# Altium integrated library CoLib.IntLib: 649 symbols (part 4 of 5)
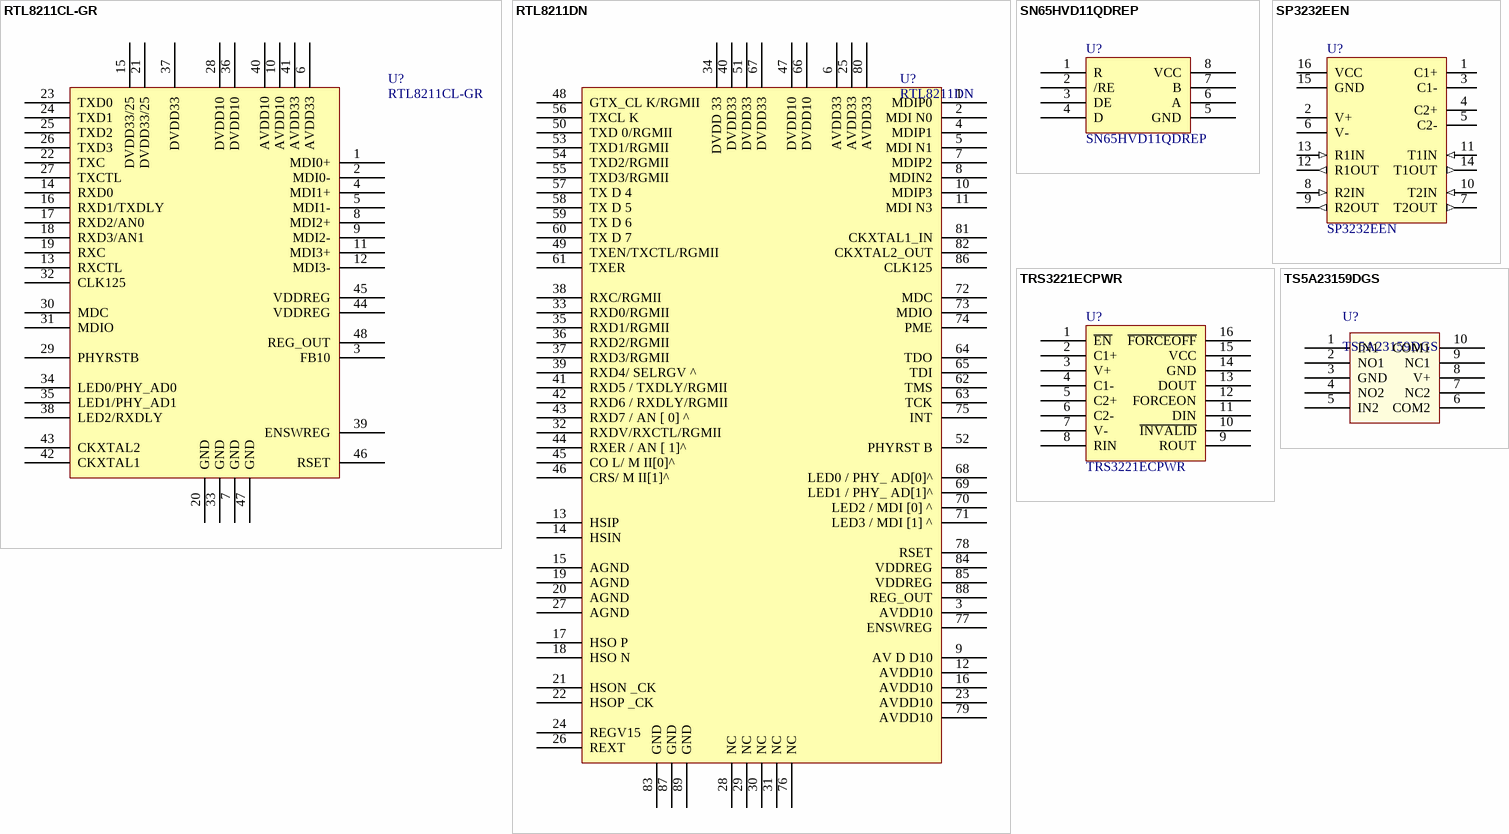
[diagram p42: symbols RTL8211CL-GR to TS5A23159DGS]

## RTL8211DN
designator U?
光口+电口PHY; Manufacturer: RealTek; Name: 网口; Price: 15; Price_Date: 2011-07; Ordering NO.: RTL8211DN
footprint QFN-88 (0.4mm间距)
pins: 1 MDIP0, 2 MDI N0, 3 AVDD10, 4 MDIP1, 5 MDI N1, 6 AVDD33, 7 MDIP2, 8 MDIN2, 9 AV D D10, 10 MDIP3, 11 MDI N3, 12 AVDD10, 13 HSIP, 14 HSIN, 15 AGND, 16 AVDD10, 17 HSO P, 18 HSO N, 19 AGND, 20 AGND, 21 HSON _CK, 22 HSOP _CK, 23 AVDD10, 24 REGV15, 25 AVDD33, 26 REXT, 27 AGND, 28 NC, 29 NC, 30 NC, 31 NC, 32 RXDV/RXCTL/RGMII, 33 RXD0/RGMII, 34 DVDD 33, 35 RXD1/RGMII, 36 RXD2/RGMII, 37 RXD3/RGMII, 38 RXC/RGMII, 39 RXD4/ SELRGV ^, 40 DVDD33, 41 RXD5 / TXDLY/RGMII, 42 RXD6 / RXDLY/RGMII, 43 RXD7 / AN [ 0] ^, 44 RXER / AN [ 1]^, 45 CO L/ M II[0]^, 46 CRS/ M II[1]^, 47 DVDD10, 48 GTX_CL K/RGMII, 49 TXEN/TXCTL/RGMII, 50 TXD 0/RGMII, 51 DVDD33, 52 PHYRST B, 53 TXD1/RGMII, 54 TXD2/RGMII, 55 TXD3/RGMII, 56 TXCL K, 57 TX D 4, 58 TX D 5, 59 TX D 6, 60 TX D 7, 61 TXER, 62 TMS, 63 TCK, 64 TDO, 65 TDI, 66 DVDD10, 67 DVDD33, 68 LED0 / PHY_ AD[0]^, 69 LED1 / PHY_ AD[1]^, 70 LED2 / MDI [0] ^, 71 LED3 / MDI [1] ^, 72 MDC, 73 MDIO, 74 PME, 75 INT, 76 NC, 77 ENSWREG, 78 RSET, 79 AVDD10, 80 AVDD33, 81 CKXTAL1_IN, 82 CKXTAL2_OUT, 83 GND, 84 VDDREG, 85 VDDREG, 86 CLK125, 87 GND, 88 REG_OUT, 89 GND

## SN65HVD11QDREP
designator U?
10MbpsRS485收发器; Manufacturer: TI; 物料型号说明: 工业温度SO-8封装; Price: 10; Name: RS485收发器; 物料替代型号: n/a; Ordering NO.: SN65HVD11QDREP
footprint SO8/1.27_4.9*3.9 (SOIC, 8-Leads, Body 4.9x3.9mm, Pitch 1.27mm,)
pins: 1 R, 2 /RE (power), 3 DE, 4 D (power), 5 GND, 6 A, 7 B, 8 VCC

## SP3232EEN
designator U?
True +3.0V to +5.5V RS-232 Transceivers; Manufacturer: EXAR; Name: RS232收发器; Ordering NO.: SP3232EEN
footprint SO16/1.27_9.9*3.9
pins: 1 C1+ (power), 2 V+ (power), 3 C1- (power), 4 C2+ (power), 5 C2- (power), 6 V- (power), 7 T2OUT (out), 8 R2IN (in), 9 R2OUT (out), 10 T2IN (in), 11 T1IN (in), 12 R1OUT (out), 13 R1IN (in), 14 T1OUT (out), 15 GND (power), 16 VCC (power)

## TRS3221ECPWR
designator U?
RS232收发器1路ESD15KV; Manufacturer: TI; 物料型号说明: 商业温度2000/盘TSSOP16; 物料替代型号: TRS3221EIPWR工业温度; tips: 单路适合做console还有很多控制使能ESD15KV很强大; Ordering NO.: TRS3221ECPWR; Name: RS232收发器; Price: 5.01
footprint TSSOP16/0.65_5.0*4.4 (TSSOP, 16-Leads, Body 5.0x4.4mm , Pitch 0.65mm, IPC Medium Density)
pins: 1 ~{EN}, 2 C1+, 3 V+, 4 C1-, 5 C2+, 6 C2-, 7 V-, 8 RIN, 9 ROUT, 10 ~{INVALID}, 11 DIN, 12 FORCEON, 13 DOUT, 14 GND, 15 VCC, 16 ~{FORCEOFF}

## TS5A23159DGS
designator U?
5-V/3.3-V 2-CHANNEL 2:1 MULTIPLEXER/DEMULTIPLEXER; Manufacturer: TI; Name: 5-V/3.3-V 2-CHANNEL 2:1 MULTIPLEXER/DEMULTIPLEXER; Ordering NO.: TS5A23159DGS
footprint MSOP10/0.5_3*3 (MSOP,8 PIN,Pitch 0.65mm,Body 3mmX3mm)
pins: 1 IN1, 2 NO1, 3 GND, 4 NO2, 5 IN2, 6 COM2, 7 NC2, 8 V+, 9 NC1, 10 COM1


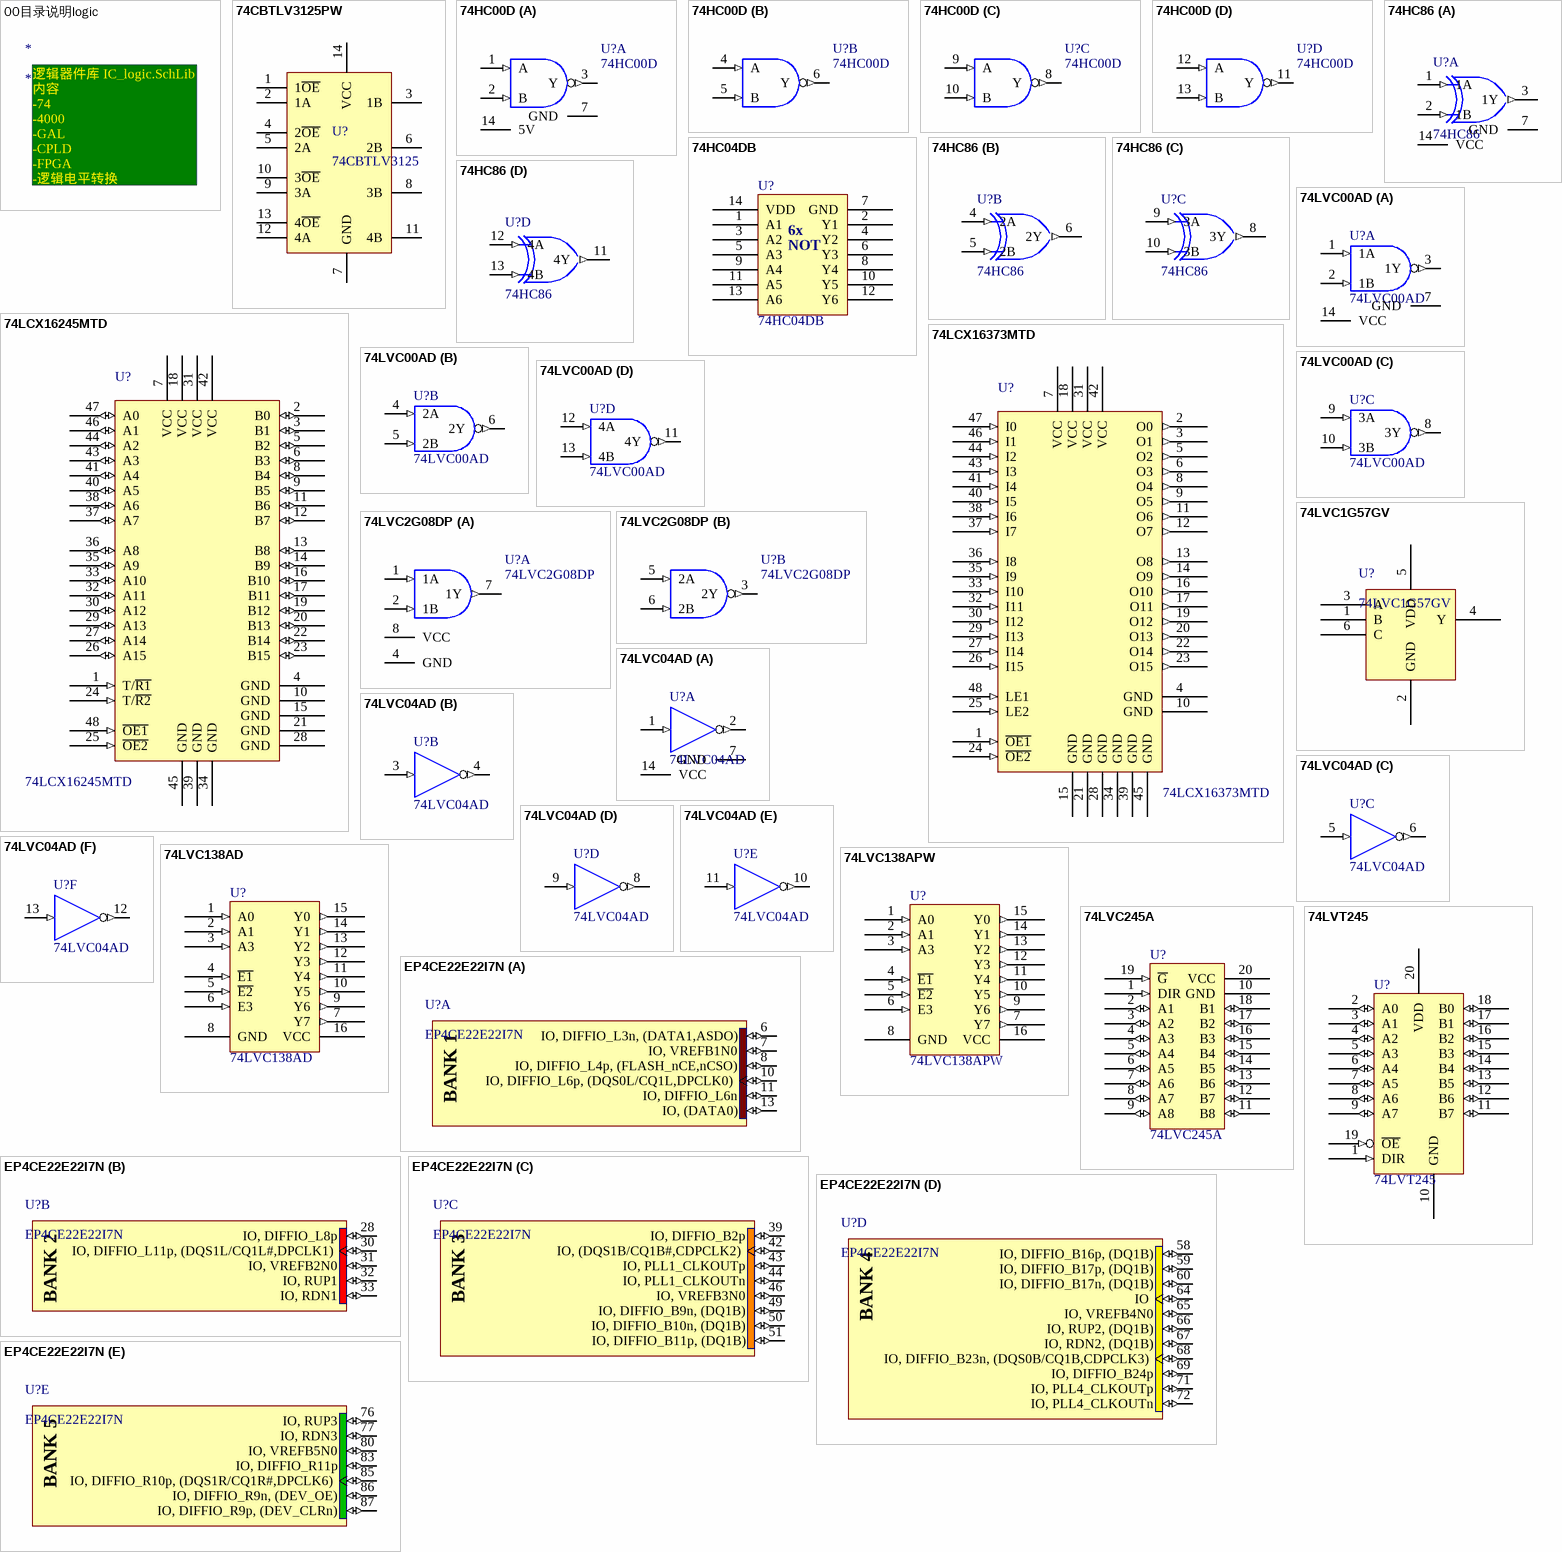
[diagram p26: symbols 00目录说明logic to EP4CE22E22I7N]

## 00目录说明logic
designator *
text: 逻辑器件库 IC_logic.SchLib / 内容 / -74 / -4000 / -GAL / -CPLD / -FPGA / -逻辑电平转换 /

## 74CBTLV3125PW
designator U?, comment 74CBTLV3125
4-bit bus switch; Manufacturer: NXP; Name: 四通道芯片; Ordering NO.: 74CBTLV3125PW
footprint TSSOP14/0.65_5.0*4.4 (TSSOP, 14-Leads, Body 5.1x4.5mm (max), Pitch 0.65mm, IPC Medium Density)
pins: 1 1~{OE}, 2 1A, 3 1B, 4 2~{OE}, 5 2A, 6 2B, 7 GND, 8 3B, 9 3A, 10 3~{OE}, 11 4B, 12 4A, 13 4~{OE}, 14 VCC

## 74HC00D
designator U?
4路2输入与非门; Manufacturer: NXP; Name: 与非门; Ordering NO.: 74HC00D
footprint SO14/1.27_8.65*3.9 (SOIC, 14-Leads, Body 8.65x3.9mm, Pitch 1.27mm, IPC Medium Density)
part A pins: 1 A (in), 2 B (in), 3 Y (out), 7 GND (power), 14 5V (power)
part B pins: 4 A (in), 5 B (in), 6 Y (out)
part C pins: 8 Y (out), 9 A (in), 10 B (in)
part D pins: 11 Y (out), 12 A (in), 13 B (in)

## 74HC04DB
designator U?
Hex inverter, 6 Channel, 5V(2V-6V); Manufacturer: NXP; Name: 反相器; Ordering NO.: 74HC04DB
footprint SSOP14/0.65_6.2*5.3 (Footprint not found)
pins: 1 A1, 2 Y1, 3 A2, 4 Y2, 5 A3, 6 Y3, 7 GND, 8 Y4, 9 A4, 10 Y5, 11 A5, 12 Y6, 13 A6, 14 VDD
text: 6x; NOT

## 74HC86
designator U?
Quad Exclusive-OR Gate; Manufacturer: NXP; Name: 异或门; Ordering NO.: 74HC86
simulation model 74HC86 (SIMCODE)
footprint SO14/1.27_8.65*3.9 (SOIC, 14-Leads, Body 8.65x3.9mm, Pitch 1.27mm, IPC Medium Density)
part A pins: 1 1A (in), 2 1B (in), 3 1Y (out), 7 GND (power), 14 VCC (power)
part B pins: 4 2A (in), 5 2B (in), 6 2Y (out)
part C pins: 8 3Y (out), 9 3A (in), 10 3B (in)
part D pins: 11 4Y (out), 12 4A (in), 13 4B (in)
1 alternate drawing of the same symbol

## 74LCX16245MTD
designator U?
Low Voltage 16-Bit Bidirectional Transceiver with 5V Tolerant Inputs and Outputs; Manufacturer: FAIRCHILD; Name: 缓冲器; Ordering NO.: 74LCX16245MTD
footprint TSSOP48/0.5_12.5*6.1 (Footprint not found)
pins: 1 T/~{R1} (in), 2 B0 (io), 3 B1 (io), 4 GND (power), 5 B2 (io), 6 B3 (io), 7 VCC (power), 8 B4 (io), 9 B5 (io), 10 GND (power), 11 B6 (io), 12 B7 (io), 13 B8 (io), 14 B9 (io), 15 GND (power), 16 B10 (io), 17 B11 (io), 18 VCC (power), 19 B12 (io), 20 B13 (io), 21 GND (power), 22 B14 (io), 23 B15 (io), 24 T/~{R2} (in), 25 ~{OE2} (in), 26 A15 (io), 27 A14 (io), 28 GND (power), 29 A13 (io), 30 A12 (io), 31 VCC (power), 32 A11 (io), 33 A10 (io), 34 GND (power), 35 A9 (io), 36 A8 (io), 37 A7 (io), 38 A6 (io), 39 GND (power), 40 A5 (io), 41 A4 (io), 42 VCC (power), 43 A3 (io), 44 A2 (io), 45 GND (power), 46 A1 (io), 47 A0 (io), 48 ~{OE1} (in)

## 74LCX16373MTD
designator U?
Low Voltage 16-Bit Transparent Latch with 5V Tolerant Inputs and Outputs; Manufacturer: NXP; Name: 缓冲器; Ordering NO.: 74LCX16373MTD
footprint TSSOP48/0.5_12.5*6.1 (TSSOP, 48-Leads, Body 12.5x6.1mm , Pitch 0.5mm,)
pins: 1 ~{OE1} (in), 2 O0 (out), 3 O1 (out), 4 GND (power), 5 O2 (out), 6 O3 (out), 7 VCC (power), 8 O4 (out), 9 O5 (out), 10 GND (power), 11 O6 (out), 12 O7 (out), 13 O8 (out), 14 O9 (out), 15 GND (power), 16 O10 (out), 17 O11 (out), 18 VCC (power), 19 O12 (out), 20 O13 (out), 21 GND (power), 22 O14 (out), 23 O15 (out), 24 ~{OE2} (in), 25 LE2 (in), 26 I15 (in), 27 I14 (in), 28 GND (power), 29 I13 (in), 30 I12 (in), 31 VCC (power), 32 I11 (in), 33 I10 (in), 34 GND (power), 35 I9 (in), 36 I8 (in), 37 I7 (in), 38 I6 (in), 39 GND (power), 40 I5 (in), 41 I4 (in), 42 VCC (power), 43 I3 (in), 44 I2 (in), 45 GND (power), 46 I1 (in), 47 I0 (in), 48 LE1 (in)

## 74LVC00AD
designator U?
Quad 2-Input Positive-NAND Gate; Manufacturer: NXP; Name: 与非门; Ordering NO.: 74LVC00AD
simulation model 74LVC00 (SIMCODE)
footprint SO14/1.27_8.65*3.9 (SOIC, 14-Leads, Body 8.65x3.9mm, Pitch 1.27mm, IPC Medium Density)
part A pins: 1 1A (in), 2 1B (in), 3 1Y (out), 7 GND (power), 14 VCC (power)
part B pins: 4 2A (in), 5 2B (in), 6 2Y (out)
part C pins: 8 3Y (out), 9 3A (in), 10 3B (in)
part D pins: 11 4Y (out), 12 4A (in), 13 4B (in)
1 alternate drawing of the same symbol

## 74LVC1G57GV
designator U?
单门SOT23-6封装; Manufacturer: NXP; 物料型号说明: 74单门SOT-23; Name: 74单门; Ordering NO.: 74LVC1G57GV; 物料替代型号: n/a; Price: 3
footprint SOT23-6 (SOT-23/SC-74A; 5 Leads; Body 3.1 x 3 mm, inc. leads (LxW max))
pins: 1 B, 2 GND, 3 A, 4 Y, 5 VDD, 6 C

## 74LVC2G08DP
designator U?
2路2输入与门; Manufacturer: PHILIPS; Name: 与门; Ordering NO.: 74LVC2G08DP
footprint TSSOP8/0.65_3*3-A (TSSOP, 8-Leads, Body 3x3mm , Pitch 0.65mm, IPC Medium Density)
part A pins: 1 1A (in), 2 1B (in), 4 GND (power), 7 1Y (out), 8 VCC (power)
part B pins: 3 2Y (out), 5 2A (in), 6 2B (in)

## 74LVC04AD
designator U?
Hex Inverter; Manufacturer: NXP; Name: 非门; Ordering NO.: 74LVC04AD
simulation model 74LVC04 (SIMCODE)
footprint SO14/1.27_8.65*3.9 (SOIC, 14-Leads, Body 8.65x3.9mm, Pitch 1.27mm, IPC Medium Density)
part A pins: 1 A (in), 2 Y (out), 7 GND (power), 14 VCC (power)
part B pins: 3 A (in), 4 Y (out)
part C pins: 5 A (in), 6 Y (out)
part D pins: 8 Y (out), 9 A (in)
part E pins: 10 Y (out), 11 A (in)
part F pins: 12 Y (out), 13 A (in)
1 alternate drawing of the same symbol

## 74LVC138AD
designator U?
3.3V CMOS 3-Line to 8-Line Decoder/Demultiplexer with 5V Tolerant I/O; Manufacturer: NXP; Name: 3-8译码器; Ordering NO.: 74LVC138AD
footprint SO16/1.27_9.9*3.9
pins: 1 A0 (in), 2 A1 (in), 3 A3 (in), 4 ~{E1} (in), 5 ~{E2} (in), 6 E3 (in), 7 Y7 (out), 8 GND (power), 9 Y6 (out), 10 Y5 (out), 11 Y4 (out), 12 Y3 (out), 13 Y2 (out), 14 Y1 (out), 15 Y0 (out), 16 VCC (power)

## 74LVC138APW
designator U?
3.3V CMOS 3-Line to 8-Line Decoder/Demultiplexer with 5V Tolerant I/O; Manufacturer: NXP; Name: 3-8译码器; Ordering NO.: 74LVC138APW
footprint TSSOP16/0.65_5.0*4.4 (TSSOP, 16-Leads, Body 5.0x4.4mm , Pitch 0.65mm, IPC Medium Density)
pins: 1 A0 (in), 2 A1 (in), 3 A3 (in), 4 ~{E1} (in), 5 ~{E2} (in), 6 E3 (in), 7 Y7 (out), 8 GND (power), 9 Y6 (out), 10 Y5 (out), 11 Y4 (out), 12 Y3 (out), 13 Y2 (out), 14 Y1 (out), 15 Y0 (out), 16 VCC (power)

## 74LVC245A
designator U?
Low Voltage CMOS Octal Bus Transceiver (not inverted) High Performance; Manufacturer: NXP; Name: 多功能门; Ordering NO.: 74LVC245A
footprint TSSOP20/0.65_6.5*4.4 (Thin Shrink Small Outline; 20 Leads; Body Width 4.4 mm; Pitch 0.65 mm)
footprint SO20/1.27_12.8*7.5 (Footprint not found)
pins: 1 DIR (in), 2 A1 (io), 3 A2 (io), 4 A3 (io), 5 A4 (io), 6 A5 (io), 7 A6 (io), 8 A7 (io), 9 A8 (io), 10 GND (power), 11 B8 (io), 12 B7 (io), 13 B6 (io), 14 B5 (io), 15 B4 (io), 16 B3 (io), 17 B2 (io), 18 B1 (io), 19 ~{G} (in), 20 VCC (power)

## 74LVT245
designator U?
74逻辑8总线缓冲门; Manufacturer: NXP; 物料替代型号: 74LCX245; Ordering NO.: 74LVT245/SSOP20; 物料型号说明: SSOP20; Price: 1.5; Name: 74逻辑8总线缓冲门
footprint SSOP20/0.65_7.2*5.3 (SSOP,Body Wide 5.3mm,25mil间距)
pins: 1 DIR (in), 2 A0 (io), 3 A1 (io), 4 A2 (io), 5 A3 (io), 6 A4 (io), 7 A5 (io), 8 A6 (io), 9 A7 (io), 10 GND (power), 11 B7 (io), 12 B6 (io), 13 B5 (io), 14 B4 (io), 15 B3 (io), 16 B2 (io), 17 B1 (io), 18 B0 (io), 19 ~{OE} (in), 20 VDD (power)

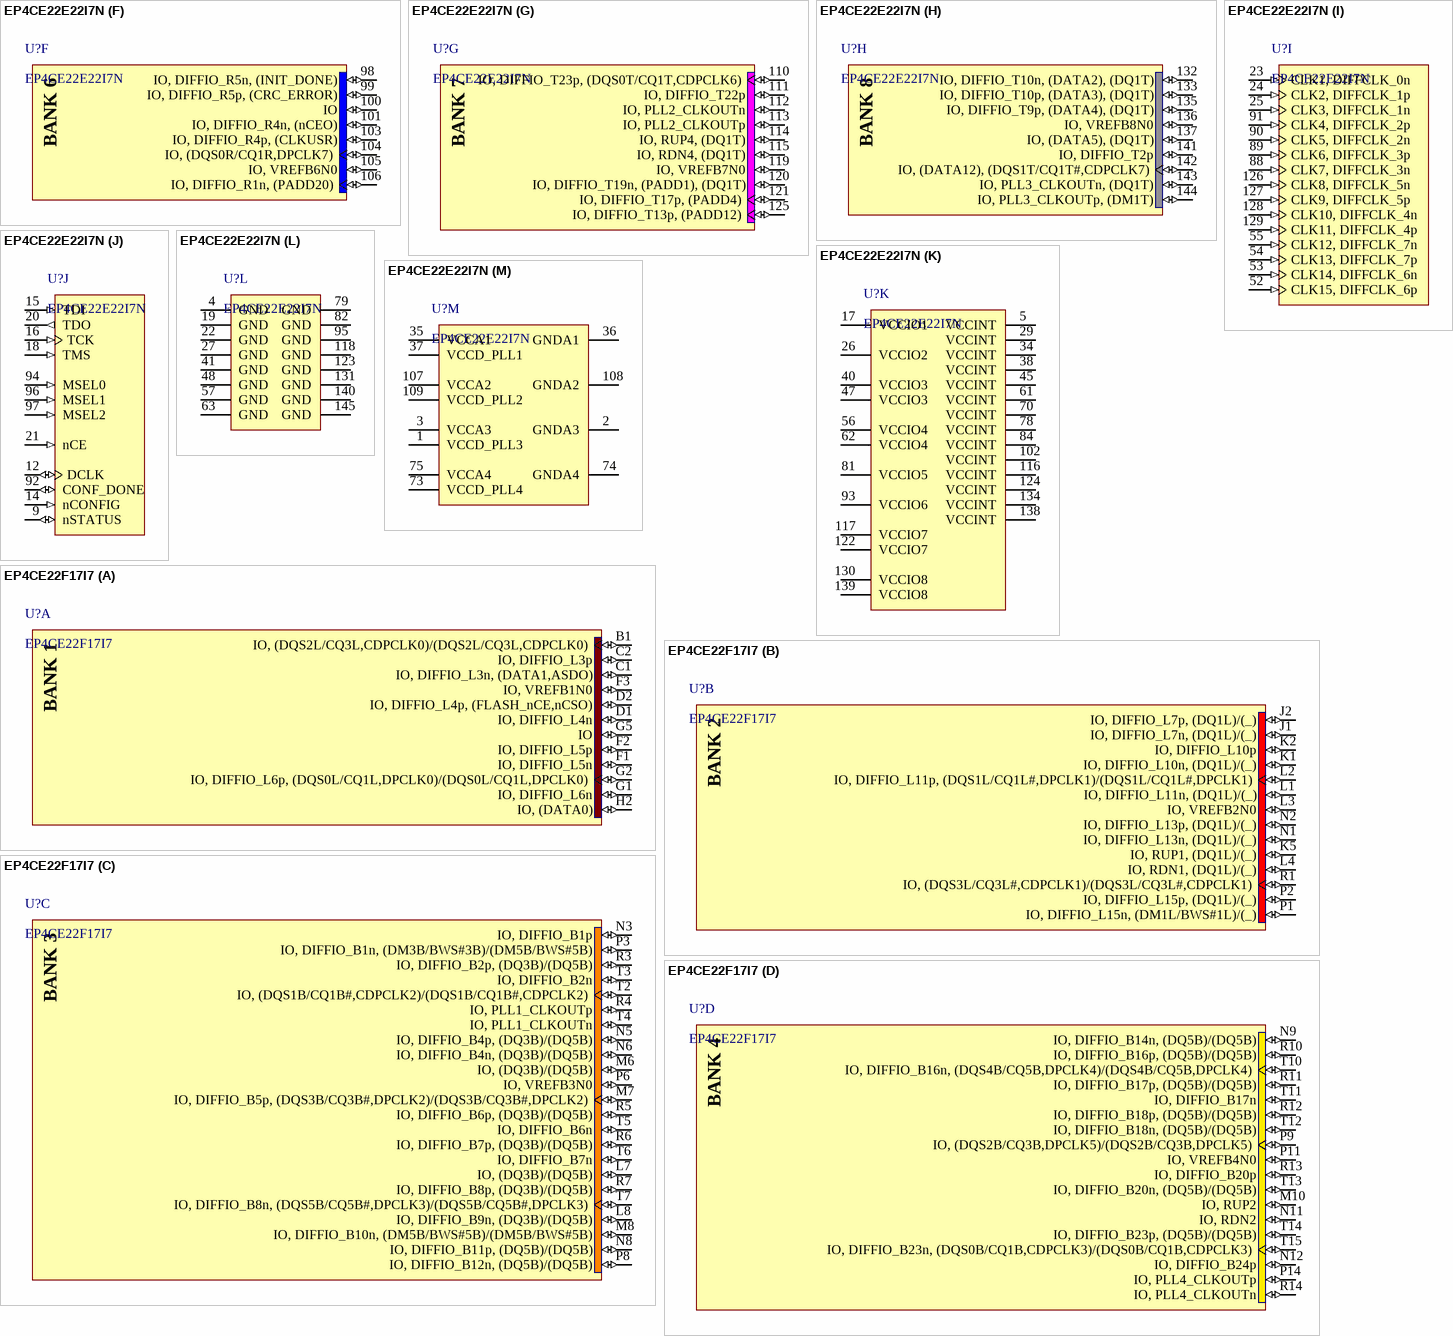
[diagram p27: symbols EP4CE22E22I7N to EP4CE22F17I7]

## EP4CE22E22I7N
designator U?
Cyclone IV Family FPGA, 1.2V Core, 79 I/O Pins, 4 PLLs, 144-Pin QFP, Speed Grade 7, Industrial Grade, Pb-Free; Manufacturer: Altera; Name: FPGA; Ordering NO.: EP4CE22E22I7N
footprint EQFP144/0.5_20*20-T (Shrink QFP, 144-Leads, Body 20x20mm, Pitch 0.5mm, Thermal Pad 6.85x6.85mm, IPC Medium Density)
part A pins: 6 IO, DIFFIO_L3n, (DATA1,ASDO) (io), 7 IO, VREFB1N0 (io), 8 IO, DIFFIO_L4p, (FLASH_nCE,nCSO) (io), 10 IO, DIFFIO_L6p, (DQS0L/CQ1L,DPCLK0) (io), 11 IO, DIFFIO_L6n (io), 13 IO, (DATA0) (io)
part B pins: 28 IO, DIFFIO_L8p (io), 30 IO, DIFFIO_L11p, (DQS1L/CQ1L#,DPCLK1) (io), 31 IO, VREFB2N0 (io), 32 IO, RUP1 (io), 33 IO, RDN1 (io)
part C pins: 39 IO, DIFFIO_B2p (io), 42 IO, (DQS1B/CQ1B#,CDPCLK2) (io), 43 IO, PLL1_CLKOUTp (io), 44 IO, PLL1_CLKOUTn (io), 46 IO, VREFB3N0 (io), 49 IO, DIFFIO_B9n, (DQ1B) (io), 50 IO, DIFFIO_B10n, (DQ1B) (io), 51 IO, DIFFIO_B11p, (DQ1B) (io)
part D pins: 58 IO, DIFFIO_B16p, (DQ1B) (io), 59 IO, DIFFIO_B17p, (DQ1B) (io), 60 IO, DIFFIO_B17n, (DQ1B) (io), 64 IO (io), 65 IO, VREFB4N0 (io), 66 IO, RUP2, (DQ1B) (io), 67 IO, RDN2, (DQ1B) (io), 68 IO, DIFFIO_B23n, (DQS0B/CQ1B,CDPCLK3) (io), 69 IO, DIFFIO_B24p (io), 71 IO, PLL4_CLKOUTp (io), 72 IO, PLL4_CLKOUTn (io)
part E pins: 76 IO, RUP3 (io), 77 IO, RDN3 (io), 80 IO, VREFB5N0 (io), 83 IO, DIFFIO_R11p (io), 85 IO, DIFFIO_R10p, (DQS1R/CQ1R#,DPCLK6) (io), 86 IO, DIFFIO_R9n, (DEV_OE) (io), 87 IO, DIFFIO_R9p, (DEV_CLRn) (io)
part F pins: 98 IO, DIFFIO_R5n, (INIT_DONE) (io), 99 IO, DIFFIO_R5p, (CRC_ERROR) (io), 100 IO (io), 101 IO, DIFFIO_R4n, (nCEO) (io), 103 IO, DIFFIO_R4p, (CLKUSR) (io), 104 IO, (DQS0R/CQ1R,DPCLK7) (io), 105 IO, VREFB6N0 (io), 106 IO, DIFFIO_R1n, (PADD20) (io)
part G pins: 110 IO, DIFFIO_T23p, (DQS0T/CQ1T,CDPCLK6) (io), 111 IO, DIFFIO_T22p (io), 112 IO, PLL2_CLKOUTn (io), 113 IO, PLL2_CLKOUTp (io), 114 IO, RUP4, (DQ1T) (io), 115 IO, RDN4, (DQ1T) (io), 119 IO, VREFB7N0 (io), 120 IO, DIFFIO_T19n, (PADD1), (DQ1T) (io), 121 IO, DIFFIO_T17p, (PADD4) (io), 125 IO, DIFFIO_T13p, (PADD12) (io)
part H pins: 132 IO, DIFFIO_T10n, (DATA2), (DQ1T) (io), 133 IO, DIFFIO_T10p, (DATA3), (DQ1T) (io), 135 IO, DIFFIO_T9p, (DATA4), (DQ1T) (io), 136 IO, VREFB8N0 (io), 137 IO, (DATA5), (DQ1T) (io), 141 IO, DIFFIO_T2p (io), 142 IO, (DATA12), (DQS1T/CQ1T#,CDPCLK7) (io), 143 IO, PLL3_CLKOUTn, (DQ1T) (io), 144 IO, PLL3_CLKOUTp, (DM1T) (io)
part I pins: 23 CLK1, DIFFCLK_0n (in), 24 CLK2, DIFFCLK_1p (in), 25 CLK3, DIFFCLK_1n (in), 52 CLK15, DIFFCLK_6p (in), 53 CLK14, DIFFCLK_6n (in), 54 CLK13, DIFFCLK_7p (in), 55 CLK12, DIFFCLK_7n (in), 88 CLK7, DIFFCLK_3n (in), 89 CLK6, DIFFCLK_3p (in), 90 CLK5, DIFFCLK_2n (in), 91 CLK4, DIFFCLK_2p (in), 126 CLK8, DIFFCLK_5n (in), 127 CLK9, DIFFCLK_5p (in), 128 CLK10, DIFFCLK_4n (in), 129 CLK11, DIFFCLK_4p (in)
part J pins: 9 nSTATUS (io), 12 DCLK (io), 14 nCONFIG (in), 15 TDI (in), 16 TCK (in), 18 TMS (in), 20 TDO (out), 21 nCE (in), 92 CONF_DONE (io), 94 MSEL0 (in), 96 MSEL1 (in), 97 MSEL2 (in)
part K pins: 5 VCCINT (power), 17 VCCIO1 (power), 26 VCCIO2 (power), 29 VCCINT (power), 34 VCCINT (power), 38 VCCINT (power), 40 VCCIO3 (power), 45 VCCINT (power), 47 VCCIO3 (power), 56 VCCIO4 (power), 61 VCCINT (power), 62 VCCIO4 (power), 70 VCCINT (power), 78 VCCINT (power), 81 VCCIO5 (power), 84 VCCINT (power), 93 VCCIO6 (power), 102 VCCINT (power), 116 VCCINT (power), 117 VCCIO7 (power), 122 VCCIO7 (power), 124 VCCINT (power), 130 VCCIO8 (power), 134 VCCINT (power), 138 VCCINT (power), 139 VCCIO8 (power)
part L pins: 4 GND (power), 19 GND (power), 22 GND (power), 27 GND (power), 41 GND (power), 48 GND (power), 57 GND (power), 63 GND (power), 79 GND (power), 82 GND (power), 95 GND (power), 118 GND (power), 123 GND (power), 131 GND (power), 140 GND (power), 145 GND (power)
part M pins: 1 VCCD_PLL3 (power), 2 GNDA3 (power), 3 VCCA3 (power), 35 VCCA1 (power), 36 GNDA1 (power), 37 VCCD_PLL1 (power), 73 VCCD_PLL4 (power), 74 GNDA4 (power), 75 VCCA4 (power), 107 VCCA2 (power), 108 GNDA2 (power), 109 VCCD_PLL2 (power)
part A text: BANK 1
part B text: BANK 2
part C text: BANK 3
part D text: BANK 4
part E text: BANK 5
part F text: BANK 6
part G text: BANK 7
part H text: BANK 8

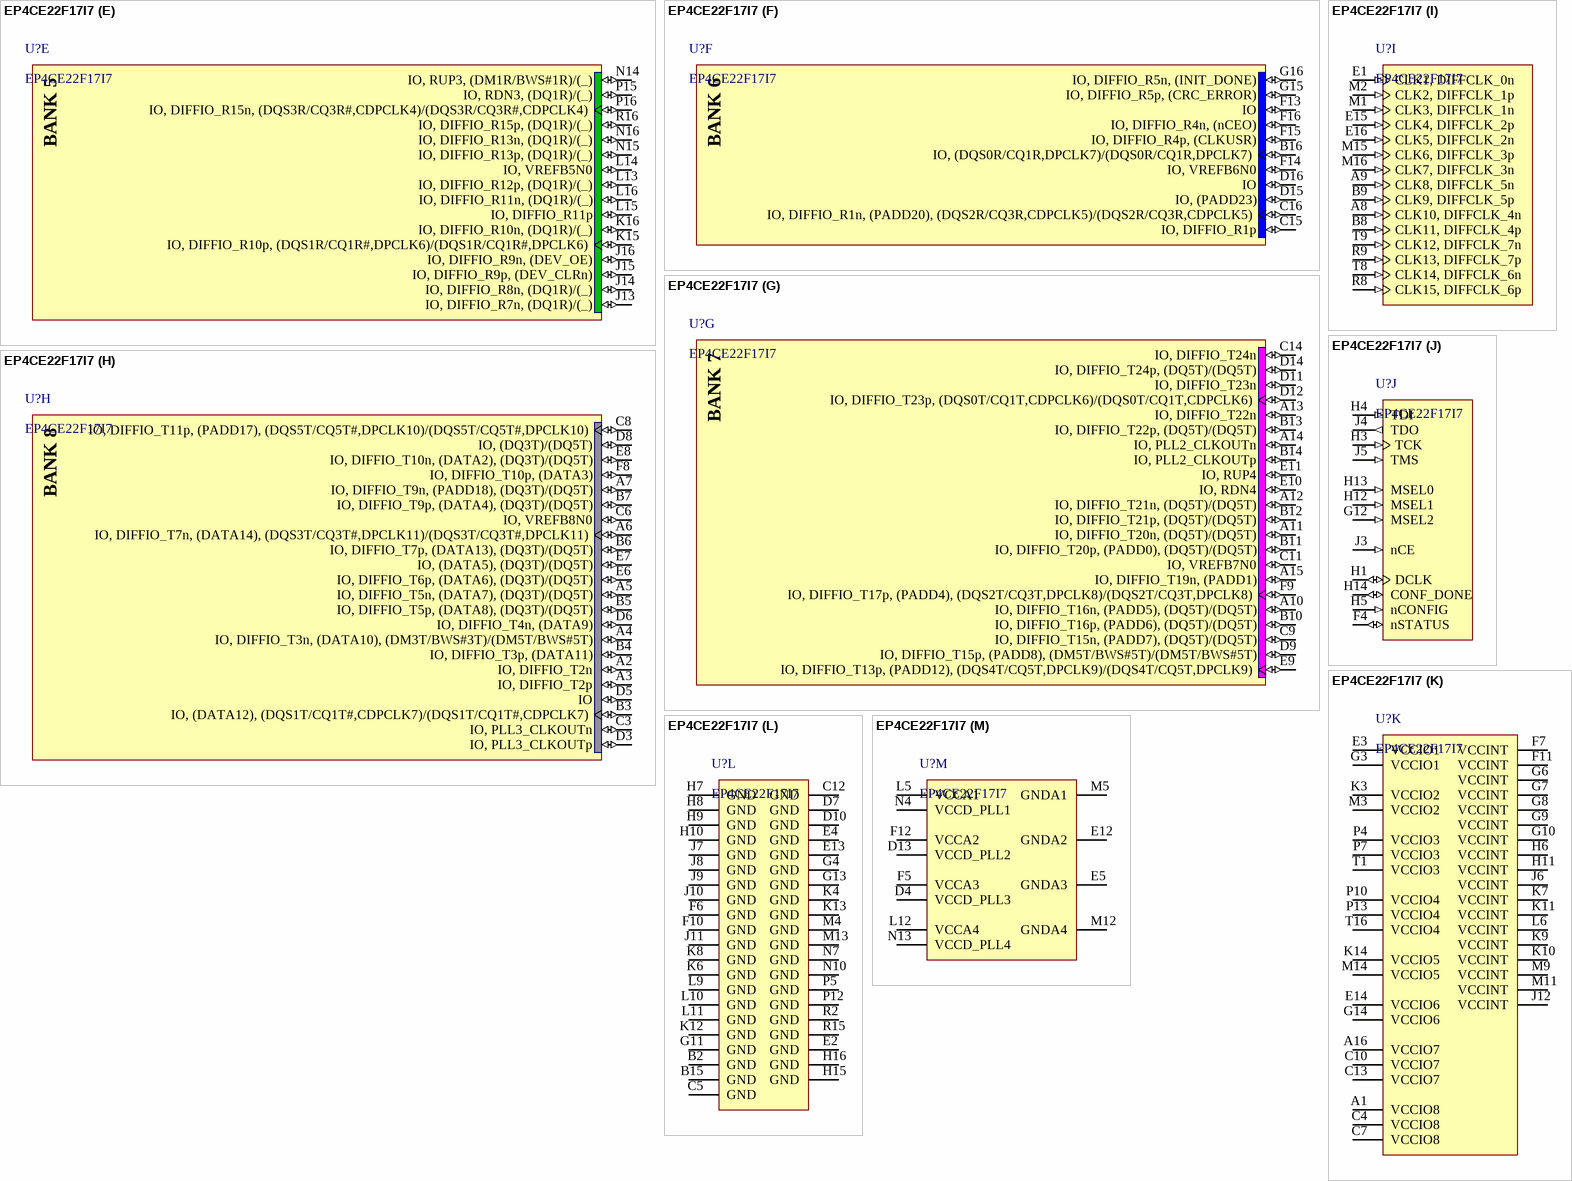
[diagram p28: symbol EP4CE22F17I7]
